# Altium footprint library myPcb.PcbLib: 145 footprints (part 3 of 10)
Each footprint in its own frame and in the unit in brackets; x right, y up, seen from the top. Pads: shape width x height; smd on the part's side, far side on the other; paste and mask are expansions set on the pad; w line width, h text height; cw(c..) or ccw(c..) is an arc to the next point about the centre after c.
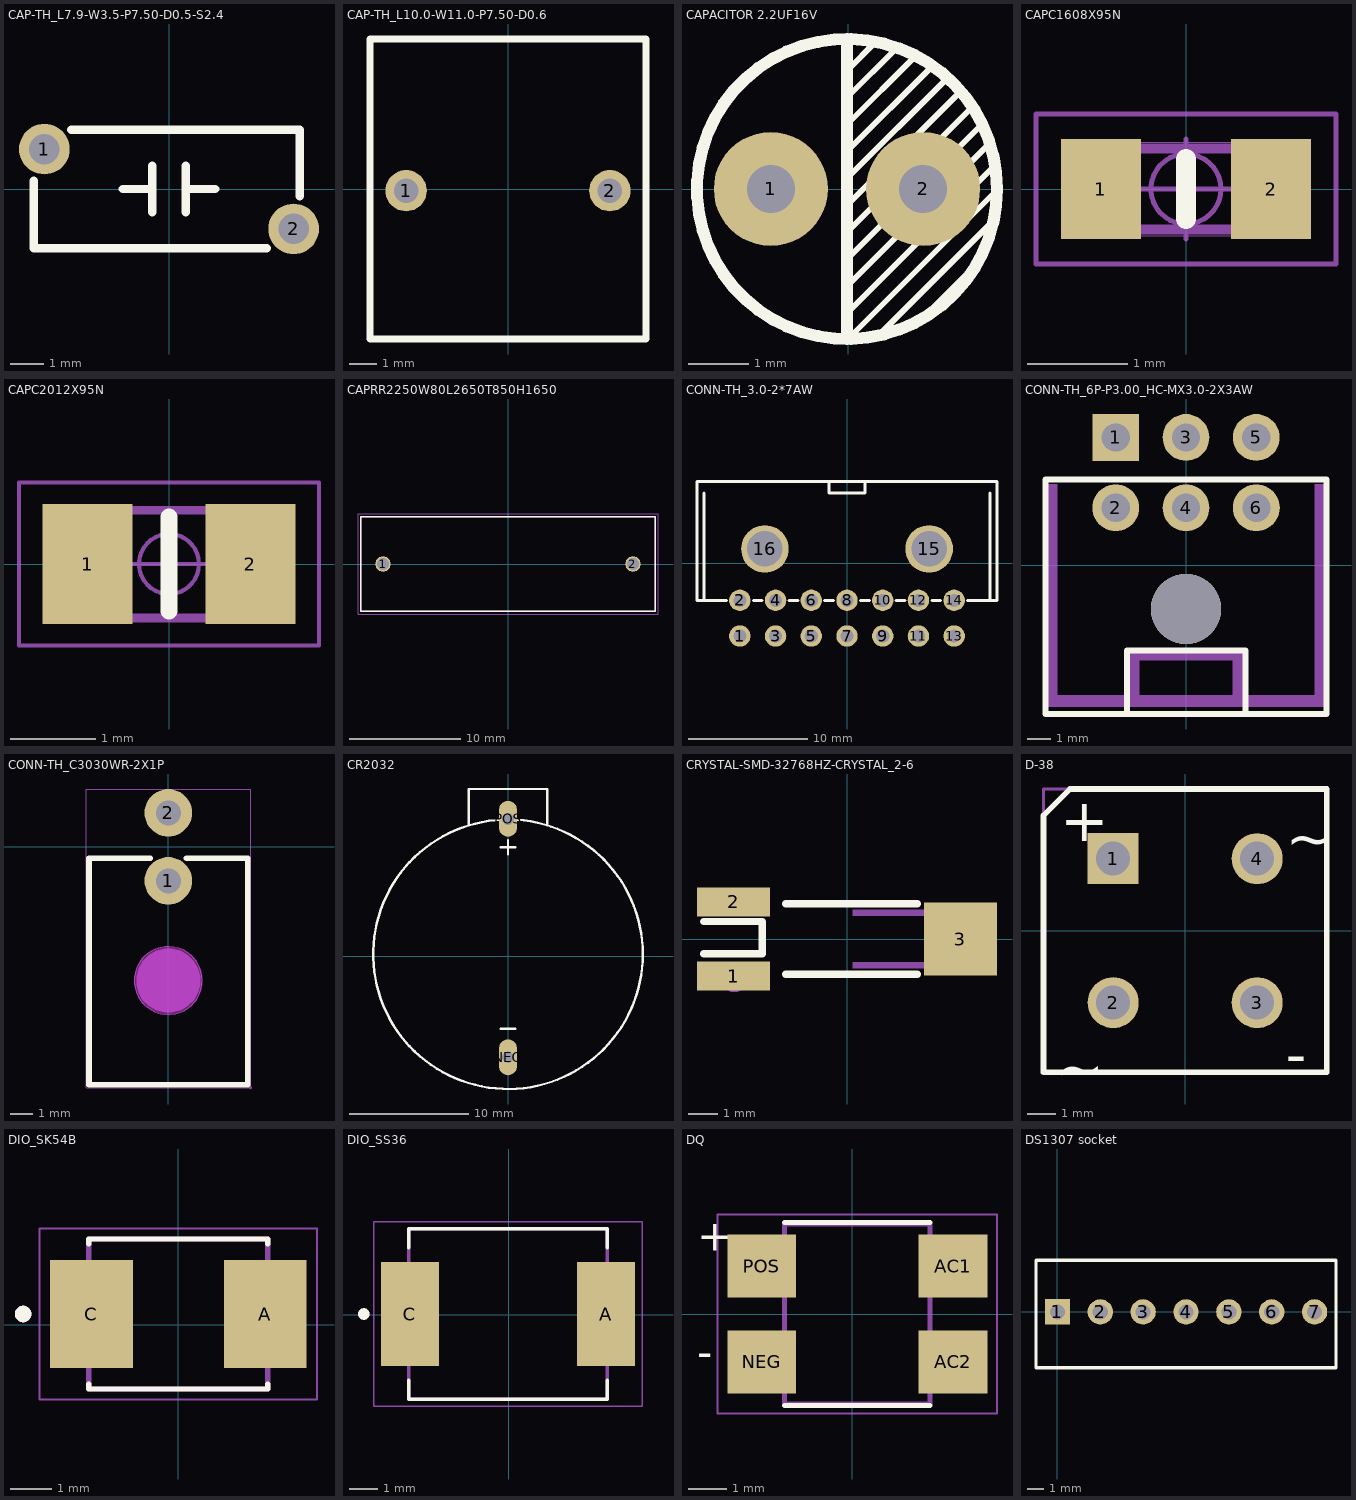
[diagram p2: the footprints below, top view; thin cyan lines are the x and y axes]

## CAP-TH_L7.9-W3.5-P7.50-D0.5-S2.4 [mil]
pads (2):
  round 60 hole 36 paste+0 mask+1.97: 1(-147.64,47.24) 2(147.64,-47.24)
Top Overlay:
  lines w10: -160,10 -160,-70 115.86,-70 ; -115.86,70 155,70 155,-8.85 ; -55,0 -20,0 ; -20,-27.5 -20,27.5 ; 20,-27.5 20,27.5 ; 20,0 55,0

## CAP-TH_L10.0-W11.0-P7.50-D0.6 [mil] "安规电容0.1uf"
pads (2):
  round 60 hole 36 paste+0 mask+1.97: 1(-147.64,-2.5) 2(147.64,-2.5)
Top Overlay:
  lines w10: -200,-217.5 200,-217.5 200,217.5 -200,217.5 -200,-217.5

## CAPACITOR 2.2UF16V [mm]
pads (2):
  round 1.9 hole 0.8 paste+0 mask+0.102: 1(-1.295,0) 2(1.245,0)
Top Overlay:
  circle w0.2: c-0.025,0 r2.5
  lines w0.1: -0.025,-2.067 2.443,0.4 ; -0.025,-1.618 2.356,0.763 ; -0.025,-1.169 2.228,1.084 ; -0.025,-0.72 2.066,1.371 ; -0.025,-0.271 1.873,1.627 ; -0.025,0.178 1.652,1.855 ; -0.025,0.627 1.402,2.053 ; -0.025,1.076 1.121,2.222 ; -0.025,1.525 0.808,2.358 ; -0.025,1.974 0.455,2.454 ; -0.025,2.423 0.052,2.499 ; -0.008,-2.499 2.475,-0.016 ; 0.496,-2.445 2.42,-0.52 ; 1.224,-2.165 2.141,-1.249
  lines w0.2: -0.025,-2.5 -0.025,2.5

## CAPC1608X95N [mm]
pads (2):
  rect 0.8x1 smd: 1(-0.85,0) 2(0.85,0)
Top Overlay:
  lines w0.2: 0,-0.3 0,0.3
Top Assembly:
  lines w0.1: -0.815,-0.405 0.815,-0.405 0.815,0.405 -0.815,0.405 -0.815,-0.405
Mechanical 18:
  circle w0.05: c0,0 r0.35
  lines w0.05: -0.5,0 0.5,0 ; 0,-0.5 0,0.5 ; -1.5,-0.75 1.5,-0.75 1.5,0.75 -1.5,0.75 -1.5,-0.75
Mechanical 19:
  lines w0.001: -0.89,-0.47 0.89,-0.47 0.89,0.47 -0.89,0.47 -0.89,-0.47

## CAPC2012X95N [mm]
pads (2):
  rect 1.05x1.4 smd: 1(-0.95,0) 2(0.95,0)
Top Overlay:
  lines w0.2: 0,-0.55 0,0.55
Top Assembly:
  lines w0.1: -1,-0.625 -1,0.625 1,0.625 1,-0.625 -1,-0.625
Mechanical 18:
  circle w0.05: c0,0 r0.35
  lines w0.05: -0.5,0 0.5,0 ; 0,-0.5 0,0.5 ; -1.75,-0.95 -1.75,0.95 1.75,0.95 1.75,-0.95 -1.75,-0.95
Mechanical 19:
  lines w0.001: -1.1,-0.675 -1.1,0.675 1.1,0.675 1.1,-0.675 -1.1,-0.675

## CAPRR2250W80L2650T850H1650 [mm]
pads (2):
  round 1.4 hole 1.05: 1(-11.25,0) 2(11.25,0)
Top Overlay:
  lines w0.127: -13.25,-4.25 -13.25,4.25 13.25,4.25 13.25,-4.25 -13.25,-4.25
Mechanical 13:
  lines w0.127: -13.25,-4.25 13.25,-4.25 13.25,4.25 -13.25,4.25 -13.25,-4.25
Mechanical 15:
  lines w0.05: -13.5,-4.5 13.5,-4.5 13.5,4.5 -13.5,4.5 -13.5,-4.5

## CONN-TH_3.0-2*7AW [mm]
pads (16):
  round 1.8 hole 1.1 paste+0 mask+0.102: 1(-8.999,-6.113) 2(-8.999,-3.114) 3(-5.999,-6.113) 4(-5.999,-3.114) 5(-3,-6.113) 6(-3,-3.114) 7(0,-6.113) 8(0,-3.114) 9(3,-6.113) 10(3,-3.114) 11(6,-6.113) 12(6,-3.114) 13(8.999,-6.113) 14(8.999,-3.114)
  round 4 hole 3 paste+0 mask+0.102: 15(6.9,1.207) 16(-6.9,1.207)
Top Overlay:
  lines w0.254: -12,-3.114 -12,5.886 ; -10.13,-3.114 -12.6,-3.114 -12.6,6.886 12.6,6.886 12.6,-3.114 10.13,-3.114 ; -7.868,-3.114 -7.131,-3.114 ; -4.868,-3.114 -4.131,-3.114 ; -1.869,-3.114 -1.131,-3.114 ; -1.5,6.886 -1.5,5.886 1.5,5.886 1.5,6.886 ; 1.131,-3.114 1.869,-3.114 ; 4.131,-3.114 4.868,-3.114 ; 7.131,-3.114 7.868,-3.114 ; 12,-3.114 12,5.886

## CONN-TH_6P-P3.00_HC-MX3.0-2X3AW [mm]
pads (7):
  rect 2x2 hole 1.2 paste+0 mask+0.05: 1(-3,5.463)
  round 2 hole 1.2 paste+0 mask+0.05: 2(-3,2.463) 3(0,5.463) 4(0,2.463) 5(3,5.463) 6(3,2.463)
  round 3 hole 3 unplated paste+0: ""(0,-1.857)
Top Overlay:
  lines w0.254: -2.523,-6.312 -2.523,-3.633 2.54,-3.633 2.54,-6.312 ; -6,-6.336 6,-6.336 6,3.663 -6,3.663 -6,-6.336
Mechanical 15:
  circle w1.05: c0,-1.857 r0.525
  region: -2.5,-6.036 -2.5,-3.536 -2,-3.536 -2,-6.036
  region: 2.5,-6.036 2.5,-3.536 2,-3.536 2,-6.036
  region: -2,-3.536 2,-3.536 2,-4.036 -2,-4.036
  region: -6,3.463 -6,-6.036 -5.5,-6.036 -5.5,3.463
  region: 6,3.463 6,-6.036 5.5,-6.036 5.5,3.463
  region: -5.5,-6.036 5.5,-6.036 5.5,-5.536 -5.5,-5.536

## CONN-TH_C3030WR-2X1P [mm]
pads (2):
  round 2.1 hole 1.1 paste+0 mask+0.051: 1(0,-1.5) 2(0,1.5)
Top Overlay:
  lines w0.254: -3.5,-8.499 -3.5,-0.5 -0.799,-0.5 ; -3.499,-8.498 -3.499,-10.499 3.501,-10.499 3.501,-8.5 ; 0.799,-0.5 3.5,-0.5 3.5,-8.499
Keep-Out Layer:
  board cut-out: 1.5,-5.9 1.5,-5.752 1.442,-5.462 1.329,-5.189 1.165,-4.944 0.956,-4.735 0.71,-4.571 0.438,-4.457 0.148,-4.4 -0.148,-4.4 -0.438,-4.457 -0.711,-4.571 -0.956,-4.735 -1.165,-4.944 -1.329,-5.189 -1.442,-5.462 -1.5,-5.752 -1.5,-5.9 -1.5,-6.048 -1.442,-6.337 -1.329,-6.61 -1.165,-6.856 -0.956,-7.065 -0.71,-7.229 -0.438,-7.342 -0.148,-7.4 0.148,-7.4 0.438,-7.342 0.711,-7.229 0.956,-7.065 1.165,-6.856 1.329,-6.61 1.442,-6.337 1.5,-6.048 1.5,-5.9
Mechanical 1:
  circle w0.005: c0,-5.9 r1.5
Mechanical 15:
  region: 0.45,1.5 0.45,1.59 0.382,1.755 0.255,1.882 0.09,1.95 -0.089,1.95 -0.255,1.881 -0.381,1.755 -0.45,1.589 -0.45,1.5 -0.45,1.41 -0.381,1.245 -0.255,1.118 -0.089,1.05 0.09,1.05 0.255,1.118 0.382,1.245 0.45,1.41 0.45,1.5
  region: 0.45,-1.5 0.45,-1.41 0.382,-1.245 0.255,-1.118 0.09,-1.05 -0.089,-1.05 -0.255,-1.119 -0.381,-1.245 -0.45,-1.411 -0.45,-1.5 -0.45,-1.59 -0.381,-1.755 -0.255,-1.882 -0.089,-1.95 0.09,-1.95 0.255,-1.882 0.382,-1.755 0.45,-1.59 0.45,-1.5
  region: 1.4,-5.9 1.4,-5.715 1.305,-5.359 1.12,-5.04 0.86,-4.78 0.54,-4.595 0.184,-4.5 -0.184,-4.5 -0.54,-4.595 -0.86,-4.78 -1.12,-5.04 -1.305,-5.359 -1.4,-5.716 -1.4,-5.9 -1.4,-6.084 -1.305,-6.44 -1.12,-6.759 -0.86,-7.02 -0.54,-7.204 -0.184,-7.3 0.184,-7.3 0.54,-7.204 0.86,-7.02 1.12,-6.759 1.305,-6.44 1.4,-6.084 1.4,-5.9
  region: 3.688,-10.626 3.687,-10.602 3.652,-10.568 3.604,-10.568 3.569,-10.602 3.568,-10.626 3.569,-10.65 3.604,-10.684 3.652,-10.684 3.687,-10.65 3.688,-10.626
  lines w0.051: -3.627,-10.626 3.628,-10.626 3.628,2.55 -3.627,2.55 -3.627,-10.626

## CR2032 [mm]
pads (2):
  oval 1.508x3.016 hole 1: NEG(-0.018,-8.455) POS(-0.018,11.545)
Top Overlay:
  circle w0.203: c-0.018,0.185 r11.3
  lines w0.203: -3.318,10.985 -3.318,14.045 3.282,14.045 3.282,10.985 ; -0.618,-6.07 0.582,-6.07 ; -0.618,9.16 0.582,9.16 ; -0.018,8.56 -0.018,9.76

## CRYSTAL-SMD-32768HZ-CRYSTAL_2-6 [mm]
pads (3):
  rect 2.5x1 smd paste+0 mask+0.051: 1(-3.885,-1.27) 2(-3.885,1.27)
  rect 2.5x2.5 smd paste+0 mask+0.051: 3(3.885,0)
Top Overlay:
  lines w0.254: -4.9,-0.5 -2.9,-0.5 -2.9,0.6 -4.9,0.6 ; -2.1,-1.2 2.4,-1.2 ; -2.1,1.2 2.4,1.2
Mechanical 15:
  region: 0.2,-1 3.7,-1 3.7,1 0.2,1 0.2,0.8 3.5,0.8 3.5,-0.8 0.2,-0.8
  lines w0.4: -3.864,-1.22 ccw(c-3.86,-1.42) -3.86,-1.22

## D-38 [mm] "Bridge Rectifier; 4 Terminals; Body 9.4 x 9.4 mm (typ); Pitch 5.08 mm"
height 9.91
pads (4):
  rect 1.8x1.8 hole 1.2: 1(-2.54,2.54)
  round 1.8 hole 1.2: 2(-2.54,-2.54) 3(2.54,-2.54) 4(2.54,2.54)
Top Overlay:
  lines w0.2: -5,-5 5,-5 5,5 -4.064,5 -5,4.064 -5,-5
  text "~" at 3.556,2.54 h1.5
  text "~" at -4.572,-5.588 h1.5
  text "-" at 3.556,-5.08 h1.5
  text "+" at -4.41,3.164 h1.5
Mechanical 13:
  lines w0.1: -5,-5 5,-5 5,5 -5,5 -5,-5
3D body: height 9.91, standoff 0, extent -5,-5 5,5

## DIO_SK54B [mm] "5A, 40V, Schottky Rectifier"
pads (2):
  rect 2x2.6 smd: A(2.1,0.254) C(-2.1,0.254)
Top Overlay:
  circle w0.2: c-3.75,0.254 r0.1
  lines w0.127: -2.163,-1.446 -2.163,-1.559 2.163,-1.559 2.163,-1.446 ; -2.163,1.954 -2.163,2.067 2.163,2.067 2.163,1.954
Mechanical 13:
  circle w0.2: c-3.75,0.254 r0.1
  lines w0.127: -2.163,-1.559 2.163,-1.559 2.163,2.067 -2.163,2.067 -2.163,-1.559
Mechanical 15:
  lines w0.05: -3.35,-1.809 3.35,-1.809 3.35,2.317 -3.35,2.317 -3.35,-1.809
3D body "step_temp.STEP": height 2.65, standoff 0, extent -2.675,-1.559 2.675,2.067

## DIO_SS36 [mm] "SS36齐纳二极管"
pads (2):
  rect 2x3.6 smd: A(3.369,0.028) C(-3.431,0.028)
Top Overlay:
  circle w0.2: c-5.031,0.028 r0.1
  lines w0.127: -3.469,-2.272 -3.469,-2.922 3.406,-2.922 3.406,-2.272 ; -3.469,2.328 -3.469,2.978 3.406,2.978 3.406,2.328
Mechanical 13:
  circle w0.2: c-5.031,0.028 r0.1
  lines w0.127: -3.469,-2.922 3.406,-2.922 3.406,2.978 -3.469,2.978 -3.469,-2.922
Mechanical 15:
  lines w0.05: -4.681,-3.172 4.619,-3.172 4.619,3.228 -4.681,3.228 -4.681,-3.172

## DQ [mm]
pads (4):
  rect 1.8x1.65 smd: AC1(2.627,1.25) AC2(2.627,-1.25) NEG(-2.373,-1.25) POS(-2.373,1.25)
Top Overlay:
  lines w0.127: -1.773,-2.395 2.027,-2.395 ; -1.773,2.395 2.027,2.395
  text "-" at -4.064,-1.397 h0.81
  text "+" at -4.064,1.651 h0.81
Mechanical 13:
  lines w0.127: -1.773,-2.35 -1.773,2.35 2.027,2.35 2.027,-2.35 -1.773,-2.35
  text "-" at -4.064,-1.397 h0.81
  text "+" at -4.064,1.651 h0.81
Mechanical 15:
  lines w0.05: -3.523,-2.6 -3.523,2.6 3.777,2.6 3.777,-2.6 -3.523,-2.6
3D body "step_temp.STEP": height 3, standoff 0, extent -3.273,-2.35 3.527,2.35

## DS1307 socket [mm] "Connector; Header; 7 Position"
pads (7):
  rect 1.5x1.5 hole 0.9: 1(0,0)
  round 1.5 hole 0.9: 2(2.54,0) 3(5.08,0) 4(7.62,0) 5(10.16,0) 6(12.7,0) 7(15.24,0)
Top Overlay:
  lines w0.2: -1.27,-3.302 -1.27,3.048 16.51,3.048 16.51,-3.302 -1.27,-3.302